# Altium footprint library EwgPassive.pcblib: 60 footprints (part 4 of 4)
Each footprint in its own frame and in the unit in brackets; x right, y up, seen from the top. Pads: shape width x height; smd on the part's side, far side on the other; paste and mask are expansions set on the pad; w line width, h text height; cw(c..) or ccw(c..) is an arc to the next point about the centre after c.
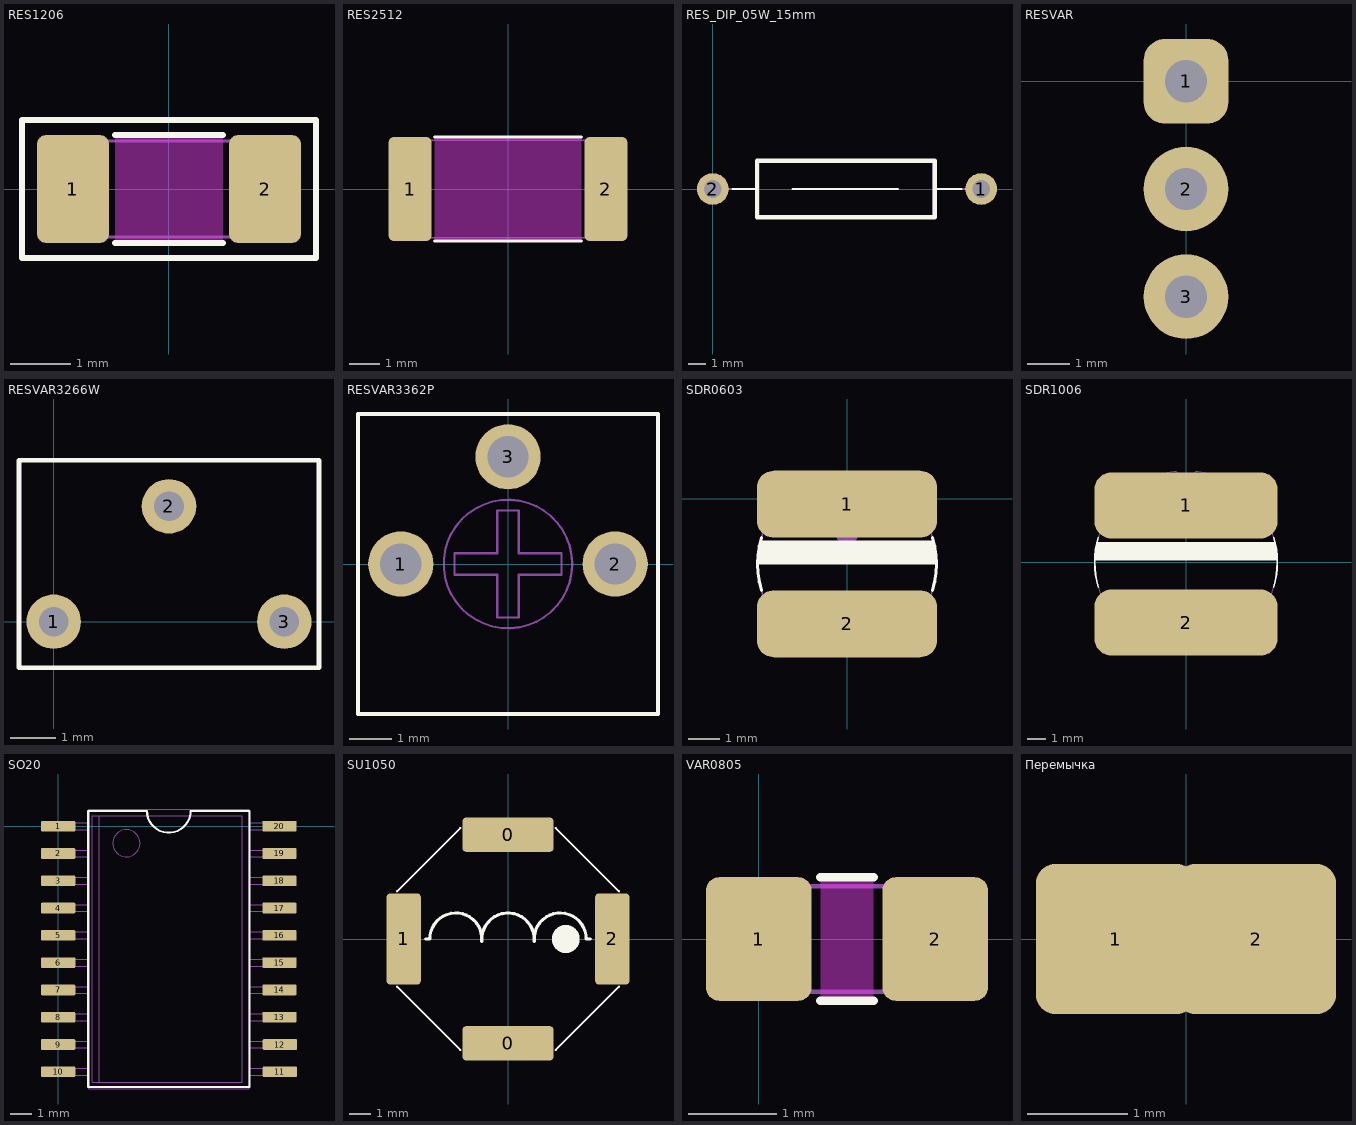
[diagram p3: the footprints below, top view; thin cyan lines are the x and y axes]

## RES1206 [mm]
pads (2):
  rrect25% 1.2x1.8 smd: 1(-1.6,0) 2(1.6,0)
Top Layer keep-out:
  region: -0.9,-0.9 0.9,-0.9 0.9,0.9 -0.9,0.9
Top Overlay:
  lines w0.1: -0.9,-0.9 0.9,-0.9 ; -0.9,0.9 0.9,0.9 ; -2.45,-1.15 -2.45,1.15 2.45,1.15 2.45,-1.15 -2.45,-1.15
Mechanical 1:
  lines w0.05: -1.1,-0.8 -1.1,0.8 ; 1.1,-0.8 1.1,0.8 ; -1.6,-0.8 1.6,-0.8 1.6,0.8 -1.6,0.8 -1.6,-0.8
3D body: height 0.61, standoff 0, extent -1.6,-0.8 1.6,0.8

## RES2512 [mm]
pads (2):
  rrect25% 1.4x3.4 smd: 1(-3.2,0) 2(3.2,0)
Top Layer keep-out:
  region: -2.4,1.7 -2.4,-1.7 2.4,-1.7 2.4,1.7
Top Overlay:
  lines w0.1: -2.4,-1.7 2.4,-1.7 ; -2.4,1.7 2.4,1.7
Mechanical 1:
  lines w0.05: -2.6,-1.6 -2.6,1.6 ; 2.6,-1.6 2.6,1.6 ; -3.2,-1.6 3.2,-1.6 3.2,1.6 -3.2,1.6 -3.2,-1.6
3D body: height 0.66, standoff 0, extent -3.15,-1.575 3.15,1.575

## RES_DIP_05W_15mm [mm] "Resistor DIP 0.5W 15.2mm"
height 4
pads (2):
  round 1.8 hole 1: 1(15.2,0) 2(0,0)
Top Overlay:
  lines w0.1: 1.1,0 2.5,0 ; 4.5,0 10.5,0 ; 12.6,0 14.1,0
  lines w0.25: 2.5,-1.6 12.575,-1.6 12.575,1.6 2.5,1.6 2.5,-1.6
Mechanical 1:
  lines w0.13: 0,0 2.5,0 ; 12.5,0 15,0 ; 2.575,-1.6 12.5,-1.6 12.5,1.6 2.575,1.6 2.575,-1.6
  text "0.5W" at 6,0.4 h0.8
  text "0.6inch" at 5.1,-1.1 h0.8
3D body: height 3.32, standoff -2, extent -0.345,-1.65 15.595,1.65

## RESVAR [mm]
pads (3):
  rrect50% 2x2 hole 1 unplated: 1(0,0)
  round 2 hole 1 unplated: 2(0,-2.54) 3(0,-5.08)

## RESVAR3266W [mm] "Couple rate"
pads (3):
  round 1.2 hole 0.65: 1(0,0) 2(2.54,2.54) 3(5.08,0)
Top Overlay:
  lines w0.1: -0.762,-1.016 -0.762,3.556 5.842,3.556 5.842,-1.016 -0.762,-1.016
3D body: height 8.25, standoff -1.91, extent -0.762,-1.016 5.944,3.48

## RESVAR3362P [mil]
pads (3):
  round 60 hole 38: 1(-98.43,0) 2(98.43,0) 3(0,98.43)
Top Overlay:
  lines w3.94: -137.8,-137.8 137.8,-137.8 137.8,137.8 -137.8,137.8 -137.8,-137.8
Mechanical 1:
  circle w1.97: c0,0 r59.06
  lines w1.97: -137.8,-137.8 137.8,-137.8 137.8,137.8 -137.8,137.8 -137.8,-137.8 ; -49.21,-9.84 -49.21,9.84 -9.84,9.84 -9.84,49.21 9.84,49.21 9.84,9.84 49.21,9.84 49.21,-9.84 9.84,-9.84 9.84,-49.21 -9.84,-49.21 -9.84,-9.84 -49.21,-9.84
3D body: height 185.04, standoff -118.11, extent -129.13,-149.21 130.71,130.32

## SDR0603 [mm]
pads (2):
  rrect50% 5.8x2.15 smd: 1(0,-0.175) 2(0,-4.025)
Top Overlay:
  region: -2.85,-1.7 -2.85,-2.1 2.9,-2.1 2.85,-1.7 2.75,-1.35 -2.75,-1.35
  lines w0.1: -2.75,-2.95 cw(c0,-2.1) -2.75,-1.25 ; 2.75,-2.95 ccw(c0,-2.1) 2.75,-1.25
Mechanical 1:
  circle w0.05: c0,-1.1 r0.35
  region: -0.35,-1.2 -0.2,-1.4 -0.05,-1.45 0,-1.45 0.1,-1.45 0.25,-1.35 0.35,-1.15 0.35,-1.05 0.3,-0.9 0.15,-0.8 0,-0.75 -0.2,-0.8 -0.3,-0.95 -0.35,-1.1
  lines w0.05: -0.652,-4.903 cw(c0,-2.1) -0.652,0.703 ; -0.65,-4.9 ccw(c-0.625,-4.675) -0.4,-4.65 -0.4,-4.45 cw(c0,-4.45) 0.4,-4.45 0.4,-4.65 ccw(c0.625,-4.675) 0.65,-4.9 ; -0.65,0.7 cw(c-0.625,0.475) -0.4,0.45 -0.4,0.25 ccw(c0,0.25) 0.4,0.25 0.4,0.45 cw(c0.625,0.475) 0.65,0.7 ; 0.652,-4.903 ccw(c0,-2.1) 0.652,0.703
  text "SRD0603" at -1.9,-3.4 h0.63
3D body: height 4, standoff 0, extent -2.85,-5 2.944,0.71

## SDR1006 [mm]
pads (2):
  rrect50% 10x3.6 smd: 1(0,3.1) 2(0,-3.3)
Top Overlay:
  region: -4.9,1.1 -5,0.1 5,0.1 4.9,1.1
  lines w0.1: -4.8,-1.35 cw(c0,0) -4.8,1.35 ; 4.8,-1.35 ccw(c0,0) 4.8,1.35
Mechanical 1:
  circle w0.05: c-0.05,2.85 r0.35
  region: -0.4,2.75 -0.25,2.55 -0.1,2.5 -0.05,2.5 0.05,2.5 0.2,2.6 0.3,2.8 0.3,2.9 0.25,3.05 0.1,3.15 -0.05,3.2 -0.25,3.15 -0.35,3 -0.4,2.85
  lines w0.05: -0.65,-4.95 ccw(c-0.625,-4.725) -0.4,-4.7 -0.4,-4.5 cw(c0,-4.5) 0.4,-4.5 0.4,-4.7 ccw(c0.625,-4.725) 0.65,-4.95 ccw(c0,0) 0.65,4.95 ccw(c0.625,4.725) 0.4,4.7 0.4,4.5 cw(c0,4.5) -0.4,4.5 -0.4,4.7 ccw(c-0.625,4.725) -0.65,4.95 ccw(c0,0) -0.65,-4.95
  text "SRD1006" at -2.3,-1 h0.63
3D body: height 5.9, standoff 0, extent -4.898,-4.875 4.9,4.873

## SO20 [mm]
pads (20):
  rrect25% 1.6x0.5 smd: 1(0,0) 2(0,-1.27) 3(0,-2.54) 4(0,-3.81) 5(0,-5.08) 6(0,-6.35) 7(0,-7.62) 8(0,-8.89) 9(0,-10.16) 10(0,-11.43) 11(10.319,-11.43) 12(10.319,-10.16) 13(10.3,-8.89) 14(10.3,-7.62) 15(10.3,-6.35) 16(10.3,-5.08) 17(10.3,-3.81) 18(10.3,-2.54) 19(10.3,-1.27) 20(10.3,0)
Top Overlay:
  lines w0.1: 1.4,-12.145 1.4,0.715 4.134,0.715 ccw(c5.15,0.715) 6.166,0.715 8.9,0.715 8.9,-12.145 1.4,-12.145
Mechanical 1:
  circle w0.05: c3.175,-0.794 r0.635
  lines w0.05: 0.635,-11.589 0.635,-11.271 ; 0.635,-10.319 0.635,-10.001 ; 0.635,-9.049 0.635,-8.731 ; 0.635,-7.779 0.635,-7.461 ; 0.635,-6.509 0.635,-6.191 ; 0.635,-5.239 0.635,-4.921 ; 0.635,-3.969 0.635,-3.651 ; 0.635,-2.699 0.635,-2.381 ; 0.635,-1.429 0.635,-1.111 ; 0.635,-0.159 0.635,0.159 ; 1.429,-11.589 0,-11.589 0,-11.271 1.429,-11.271 ; 1.429,-10.319 0,-10.319 0,-10.001 1.429,-10.001 ; 1.429,-9.049 0,-9.049 0,-8.731 1.429,-8.731 ; 1.429,-7.779 0,-7.779 0,-7.461 1.429,-7.461 ; 1.429,-6.509 0,-6.509 0,-6.191 1.429,-6.191 ; 1.429,-5.239 0,-5.239 0,-4.921 1.429,-4.921 ; 1.429,-3.969 0,-3.969 0,-3.651 1.429,-3.651 ; 1.429,-2.699 0,-2.699 0,-2.381 1.429,-2.381 ; 1.429,-1.429 0,-1.429 0,-1.111 1.429,-1.111 ; 1.429,-0.159 0,-0.159 0,0.159 1.429,0.159 ; 1.905,-11.906 1.905,0.476 ; 8.89,-11.589 10.319,-11.589 10.319,-11.271 8.89,-11.271 ; 8.89,-10.319 10.319,-10.319 10.319,-10.001 8.89,-10.001 ; 8.89,-9.049 10.319,-9.049 10.319,-8.731 8.89,-8.731 ; 8.89,-7.779 10.319,-7.779 10.319,-7.461 8.89,-7.461 ; 8.89,-6.509 10.319,-6.509 10.319,-6.191 8.89,-6.191 ; 8.89,-5.239 10.319,-5.239 10.319,-4.921 8.89,-4.921 ; 8.89,-3.969 10.319,-3.969 10.319,-3.651 8.89,-3.651 ; 8.89,-2.699 10.319,-2.699 10.319,-2.381 8.89,-2.381 ; 8.89,-1.429 10.319,-1.429 10.319,-1.111 8.89,-1.111 ; 8.89,-0.159 10.319,-0.159 10.319,0.159 8.89,0.159 ; 9.684,-11.589 9.684,-11.271 ; 9.684,-10.319 9.684,-10.001 ; 9.684,-9.049 9.684,-8.731 ; 9.684,-7.779 9.684,-7.461 ; 9.684,-6.509 9.684,-6.191 ; 9.684,-5.239 9.684,-4.921 ; 9.684,-3.969 9.684,-3.651 ; 9.684,-2.699 9.684,-2.381 ; 9.684,-1.429 9.684,-1.111 ; 9.684,-0.159 9.684,0.159 ; 1.429,-12.224 1.429,0.794 8.89,0.794 8.89,-12.224 1.429,-12.224 ; 1.587,-11.906 1.587,0.476 8.572,0.476 8.572,-11.906 1.587,-11.906

## SU1050 [mm] "IND"
height 4.8
pads (4):
  rrect25% 4.2x1.6 smd: 0(0,-4.8) 0(0,4.8)
  rrect25% 1.6x4.2 smd: 1(-4.8,0) 2(4.8,0)
Top Overlay:
  circle w1: c2.659,0 r0.141
  lines w0.1: -5.1,-2.2 -2.2,-5.1 ; -5.1,2.2 -2.2,5.1 ; 2.2,-5.1 5.1,-2.2 ; 2.2,5.1 5.1,2.2
  lines w0.15: -3.8,0 -3.6,0 cw(c-2.4,0) -1.204,-0.1 ; -1.196,-0.1 cw(c0,0) 1.196,-0.1 ; 1.204,-0.1 cw(c2.4,0) 3.6,0 3.8,0
3D body: height 4.81, standoff 0, extent -5,-4.9 5,5.1

## VAR0805 [mm]
pads (2):
  rrect25% 1.2x1.4 smd: 1(0,0) 2(2,0)
Top Layer keep-out:
  region: 0.7,-0.7 1.3,-0.7 1.3,0.7 0.7,0.7
Top Overlay:
  lines w0.1: 0.7,-0.7 1.3,-0.7 ; 0.7,0.7 1.3,0.7
Mechanical 1:
  lines w0.05: 0.5,-0.6 0.5,0.6 ; 1.5,-0.6 1.5,0.6 ; 0,-0.6 2,-0.6 2,0.6 0,0.6 0,-0.6
3D body: height 1, standoff 0, extent 0,-0.625 2,0.625

## Перемычка [mm]
pads (2):
  rrect25% 1.6x1.5 smd: 1(-0.7,0) 2(0.7,0)